# Altium footprint library smd-ipc.PCBLIB: 363 footprints (part 23 of 27) (continued)
## SQFP-S-28X28-352 [mm] (continued)
Top Overlay:
  circle w0.254: c-12.25,-12.25 r0.75
  lines w0.203: -13.67,-13.66 13.66,-13.66 13.66,13.66 -13.67,13.66 -13.67,-13.66
Mechanical 16:
  drawing of 356 lines, arcs and shapes, not listed
Mechanical 27:
  lines w0.2: -15.9,-15.9 -15.9,15.9 15.9,15.9 15.9,-15.9 -15.9,-15.9

## SQFP-S-28X28-360 [mm]
pads (360):
  rect 0.17x1.6 smd: 1(-13.35,-14.6) 2(-13.05,-14.6) 3(-12.75,-14.6) 4(-12.45,-14.6) 5(-12.15,-14.6) 6(-11.85,-14.6) 7(-11.55,-14.6) 8(-11.25,-14.6) 9(-10.95,-14.6) 10(-10.65,-14.6) 11(-10.35,-14.6) 12(-10.05,-14.6) 13(-9.75,-14.6) 14(-9.45,-14.6) 15(-9.15,-14.6) 16(-8.85,-14.6) 17(-8.55,-14.6) 18(-8.25,-14.6) 19(-7.95,-14.6) 20(-7.65,-14.6) 21(-7.35,-14.6) 22(-7.05,-14.6) 23(-6.75,-14.6) 24(-6.45,-14.6) 25(-6.15,-14.6) 26(-5.85,-14.6) 27(-5.55,-14.6) 28(-5.25,-14.6) 29(-4.95,-14.6) 30(-4.65,-14.6) 31(-4.35,-14.6) 32(-4.05,-14.6) 33(-3.75,-14.6) 34(-3.45,-14.6) 35(-3.15,-14.6) 36(-2.85,-14.6) 37(-2.55,-14.6) 38(-2.25,-14.6) 39(-1.95,-14.6) 40(-1.65,-14.6) 41(-1.35,-14.6) 42(-1.05,-14.6) 43(-0.75,-14.6) 44(-0.45,-14.6) 45(-0.15,-14.6) 46(0.15,-14.6) 47(0.45,-14.6) 48(0.75,-14.6) 49(1.05,-14.6) 50(1.35,-14.6) 51(1.65,-14.6) 52(1.95,-14.6) 53(2.25,-14.6) 54(2.55,-14.6) 55(2.85,-14.6) 56(3.15,-14.6) 57(3.45,-14.6) 58(3.75,-14.6) 59(4.05,-14.6) 60(4.35,-14.6) 61(4.65,-14.6) 62(4.95,-14.6) 63(5.25,-14.6) 64(5.55,-14.6) 65(5.85,-14.6) 66(6.15,-14.6) 67(6.45,-14.6) 68(6.75,-14.6) 69(7.05,-14.6) 70(7.35,-14.6) 71(7.65,-14.6) 72(7.95,-14.6) 73(8.25,-14.6) 74(8.55,-14.6) 75(8.85,-14.6) 76(9.15,-14.6) 77(9.45,-14.6) 78(9.75,-14.6) 79(10.05,-14.6) 80(10.35,-14.6) 81(10.65,-14.6) 82(10.95,-14.6) 83(11.25,-14.6) 84(11.55,-14.6) 85(11.85,-14.6) 86(12.15,-14.6) 87(12.45,-14.6) 88(12.75,-14.6) 89(13.05,-14.6) 90(13.35,-14.6) 181(13.35,14.6) 182(13.05,14.6) 183(12.75,14.6) 184(12.45,14.6) 185(12.15,14.6) 186(11.85,14.6) 187(11.55,14.6) 188(11.25,14.6) 189(10.95,14.6) 190(10.65,14.6) 191(10.35,14.6) 192(10.05,14.6) 193(9.75,14.6) 194(9.45,14.6) 195(9.15,14.6) 196(8.85,14.6) 197(8.55,14.6) 198(8.25,14.6) 199(7.95,14.6) 200(7.65,14.6) 201(7.35,14.6) 202(7.05,14.6) 203(6.75,14.6) 204(6.45,14.6) 205(6.15,14.6) 206(5.85,14.6) 207(5.55,14.6) 208(5.25,14.6) 209(4.95,14.6) 210(4.65,14.6) 211(4.35,14.6) 212(4.05,14.6) 213(3.75,14.6) 214(3.45,14.6) 215(3.15,14.6) 216(2.85,14.6) 217(2.55,14.6) 218(2.25,14.6) 219(1.95,14.6) 220(1.65,14.6) 221(1.35,14.6) 222(1.05,14.6) 223(0.75,14.6) 224(0.45,14.6) 225(0.15,14.6) 226(-0.15,14.6) 227(-0.45,14.6) 228(-0.75,14.6) 229(-1.05,14.6) 230(-1.35,14.6) 231(-1.65,14.6) 232(-1.95,14.6) 233(-2.25,14.6) 234(-2.55,14.6) 235(-2.85,14.6) 236(-3.15,14.6) 237(-3.45,14.6) 238(-3.75,14.6) 239(-4.05,14.6) 240(-4.35,14.6) 241(-4.65,14.6) 242(-4.95,14.6) 243(-5.25,14.6) 244(-5.55,14.6) 245(-5.85,14.6) 246(-6.15,14.6) 247(-6.45,14.6) 248(-6.75,14.6) 249(-7.05,14.6) 250(-7.35,14.6) 251(-7.65,14.6) 252(-7.95,14.6) 253(-8.25,14.6) 254(-8.55,14.6) 255(-8.85,14.6) 256(-9.15,14.6) 257(-9.45,14.6) 258(-9.75,14.6) 259(-10.05,14.6) 260(-10.35,14.6) 261(-10.65,14.6) 262(-10.95,14.6) 263(-11.25,14.6) 264(-11.55,14.6) 265(-11.85,14.6) 266(-12.15,14.6) 267(-12.45,14.6) 268(-12.75,14.6) 269(-13.05,14.6) 270(-13.35,14.6)
  rect 1.6x0.17 smd: 91(14.6,-13.35) 92(14.6,-13.05) 93(14.6,-12.75) 94(14.6,-12.45) 95(14.6,-12.15) 96(14.6,-11.85) 97(14.6,-11.55) 98(14.6,-11.25) 99(14.6,-10.95) 100(14.6,-10.65) 101(14.6,-10.35) 102(14.6,-10.05) 103(14.6,-9.75) 104(14.6,-9.45) 105(14.6,-9.15) 106(14.6,-8.85) 107(14.6,-8.55) 108(14.6,-8.25) 109(14.6,-7.95) 110(14.6,-7.65) 111(14.6,-7.35) 112(14.6,-7.05) 113(14.6,-6.75) 114(14.6,-6.45) 115(14.6,-6.15) 116(14.6,-5.85) 117(14.6,-5.55) 118(14.6,-5.25) 119(14.6,-4.95) 120(14.6,-4.65) 121(14.6,-4.35) 122(14.6,-4.05) 123(14.6,-3.75) 124(14.6,-3.45) 125(14.6,-3.15) 126(14.6,-2.85) 127(14.6,-2.55) 128(14.6,-2.25) 129(14.6,-1.95) 130(14.6,-1.65) 131(14.6,-1.35) 132(14.6,-1.05) 133(14.6,-0.75) 134(14.6,-0.45) 135(14.6,-0.15) 136(14.6,0.15) 137(14.6,0.45) 138(14.6,0.75) 139(14.6,1.05) 140(14.6,1.35) 141(14.6,1.65) 142(14.6,1.95) 143(14.6,2.25) 144(14.6,2.55) 145(14.6,2.85) 146(14.6,3.15) 147(14.6,3.45) 148(14.6,3.75) 149(14.6,4.05) 150(14.6,4.35) 151(14.6,4.65) 152(14.6,4.95) 153(14.6,5.25) 154(14.6,5.55) 155(14.6,5.85) 156(14.6,6.15) 157(14.6,6.45) 158(14.6,6.75) 159(14.6,7.05) 160(14.6,7.35) 161(14.6,7.65) 162(14.6,7.95) 163(14.6,8.25) 164(14.6,8.55) 165(14.6,8.85) 166(14.6,9.15) 167(14.6,9.45) 168(14.6,9.75) 169(14.6,10.05) 170(14.6,10.35) 171(14.6,10.65) 172(14.6,10.95) 173(14.6,11.25) 174(14.6,11.55) 175(14.6,11.85) 176(14.6,12.15) 177(14.6,12.45) 178(14.6,12.75) 179(14.6,13.05) 180(14.6,13.35) 271(-14.6,13.35) 272(-14.6,13.05) 273(-14.6,12.75) 274(-14.6,12.45) 275(-14.6,12.15) 276(-14.6,11.85) 277(-14.6,11.55) 278(-14.6,11.25) 279(-14.6,10.95) 280(-14.6,10.65) 281(-14.6,10.35) 282(-14.6,10.05) 283(-14.6,9.75) 284(-14.6,9.45) 285(-14.6,9.15) 286(-14.6,8.85) 287(-14.6,8.55) 288(-14.6,8.25) 289(-14.6,7.95) 290(-14.6,7.65) 291(-14.6,7.35) 292(-14.6,7.05) 293(-14.6,6.75) 294(-14.6,6.45) 295(-14.6,6.15) 296(-14.6,5.85) 297(-14.6,5.55) 298(-14.6,5.25) 299(-14.6,4.95) 300(-14.6,4.65) 301(-14.6,4.35) 302(-14.6,4.05) 303(-14.6,3.75) 304(-14.6,3.45) 305(-14.6,3.15) 306(-14.6,2.85) 307(-14.6,2.55) 308(-14.6,2.25) 309(-14.6,1.95) 310(-14.6,1.65) 311(-14.6,1.35) 312(-14.6,1.05) 313(-14.6,0.75) 314(-14.6,0.45) 315(-14.6,0.15) 316(-14.6,-0.15) 317(-14.6,-0.45) 318(-14.6,-0.75) 319(-14.6,-1.05) 320(-14.6,-1.35) 321(-14.6,-1.65) 322(-14.6,-1.95) 323(-14.6,-2.25) 324(-14.6,-2.55) 325(-14.6,-2.85) 326(-14.6,-3.15) 327(-14.6,-3.45) 328(-14.6,-3.75) 329(-14.6,-4.05) 330(-14.6,-4.35) 331(-14.6,-4.65) 332(-14.6,-4.95) 333(-14.6,-5.25) 334(-14.6,-5.55) 335(-14.6,-5.85) 336(-14.6,-6.15) 337(-14.6,-6.45) 338(-14.6,-6.75) 339(-14.6,-7.05) 340(-14.6,-7.35) 341(-14.6,-7.65) 342(-14.6,-7.95) 343(-14.6,-8.25) 344(-14.6,-8.55) 345(-14.6,-8.85) 346(-14.6,-9.15) 347(-14.6,-9.45) 348(-14.6,-9.75) 349(-14.6,-10.05) 350(-14.6,-10.35) 351(-14.6,-10.65) 352(-14.6,-10.95) 353(-14.6,-11.25) 354(-14.6,-11.55) 355(-14.6,-11.85) 356(-14.6,-12.15) 357(-14.6,-12.45) 358(-14.6,-12.75) 359(-14.6,-13.05) 360(-14.6,-13.35)
Top Overlay:
  circle w0.254: c-12.25,-12.25 r0.75
  lines w0.203: -13.67,-13.66 13.66,-13.66 13.66,13.66 -13.67,13.66 -13.67,-13.66
Mechanical 16:
  drawing of 364 lines, arcs and shapes, not listed
Mechanical 27:
  lines w0.2: -15.9,-15.9 -15.9,15.9 15.9,15.9 15.9,-15.9 -15.9,-15.9

## SQFP-S-32X32-184 [mm]
pads (184):
  rect 0.4x1.8 smd: 1(-14.625,-17) 2(-13.975,-17) 3(-13.325,-17) 4(-12.675,-17) 5(-12.025,-17) 6(-11.375,-17) 7(-10.725,-17) 8(-10.075,-17) 9(-9.425,-17) 10(-8.775,-17) 11(-8.125,-17) 12(-7.475,-17) 13(-6.825,-17) 14(-6.175,-17) 15(-5.525,-17) 16(-4.875,-17) 17(-4.225,-17) 18(-3.575,-17) 19(-2.925,-17) 20(-2.275,-17) 21(-1.625,-17) 22(-0.975,-17) 23(-0.325,-17) 24(0.325,-17) 25(0.975,-17) 26(1.625,-17) 27(2.275,-17) 28(2.925,-17) 29(3.575,-17) 30(4.225,-17) 31(4.875,-17) 32(5.525,-17) 33(6.175,-17) 34(6.825,-17) 35(7.475,-17) 36(8.125,-17) 37(8.775,-17) 38(9.425,-17) 39(10.075,-17) 40(10.725,-17) 41(11.375,-17) 42(12.025,-17) 43(12.675,-17) 44(13.325,-17) 45(13.975,-17) 46(14.625,-17) 93(14.625,17) 94(13.975,17) 95(13.325,17) 96(12.675,17) 97(12.025,17) 98(11.375,17) 99(10.725,17) 100(10.075,17) 101(9.425,17) 102(8.775,17) 103(8.125,17) 104(7.475,17) 105(6.825,17) 106(6.175,17) 107(5.525,17) 108(4.875,17) 109(4.225,17) 110(3.575,17) 111(2.925,17) 112(2.275,17) 113(1.625,17) 114(0.975,17) 115(0.325,17) 116(-0.325,17) 117(-0.975,17) 118(-1.625,17) 119(-2.275,17) 120(-2.925,17) 121(-3.575,17) 122(-4.225,17) 123(-4.875,17) 124(-5.525,17) 125(-6.175,17) 126(-6.825,17) 127(-7.475,17) 128(-8.125,17) 129(-8.775,17) 130(-9.425,17) 131(-10.075,17) 132(-10.725,17) 133(-11.375,17) 134(-12.025,17) 135(-12.675,17) 136(-13.325,17) 137(-13.975,17) 138(-14.625,17)
  rect 1.8x0.4 smd: 47(17,-14.625) 48(17,-13.975) 49(17,-13.325) 50(17,-12.675) 51(17,-12.025) 52(17,-11.375) 53(17,-10.725) 54(17,-10.075) 55(17,-9.425) 56(17,-8.775) 57(17,-8.125) 58(17,-7.475) 59(17,-6.825) 60(17,-6.175) 61(17,-5.525) 62(17,-4.875) 63(17,-4.225) 64(17,-3.575) 65(17,-2.925) 66(17,-2.275) 67(17,-1.625) 68(17,-0.975) 69(17,-0.325) 70(17,0.325) 71(17,0.975) 72(17,1.625) 73(17,2.275) 74(17,2.925) 75(17,3.575) 76(17,4.225) 77(17,4.875) 78(17,5.525) 79(17,6.175) 80(17,6.825) 81(17,7.475) 82(17,8.125) 83(17,8.775) 84(17,9.425) 85(17,10.075) 86(17,10.725) 87(17,11.375) 88(17,12.025) 89(17,12.675) 90(17,13.325) 91(17,13.975) 92(17,14.625) 139(-17,14.625) 140(-17,13.975) 141(-17,13.325) 142(-17,12.675) 143(-17,12.025) 144(-17,11.375) 145(-17,10.725) 146(-17,10.075) 147(-17,9.425) 148(-17,8.775) 149(-17,8.125) 150(-17,7.475) 151(-17,6.825) 152(-17,6.175) 153(-17,5.525) 154(-17,4.875) 155(-17,4.225) 156(-17,3.575) 157(-17,2.925) 158(-17,2.275) 159(-17,1.625) 160(-17,0.975) 161(-17,0.325) 162(-17,-0.325) 163(-17,-0.975) 164(-17,-1.625) 165(-17,-2.275) 166(-17,-2.925) 167(-17,-3.575) 168(-17,-4.225) 169(-17,-4.875) 170(-17,-5.525) 171(-17,-6.175) 172(-17,-6.825) 173(-17,-7.475) 174(-17,-8.125) 175(-17,-8.775) 176(-17,-9.425) 177(-17,-10.075) 178(-17,-10.725) 179(-17,-11.375) 180(-17,-12.025) 181(-17,-12.675) 182(-17,-13.325) 183(-17,-13.975) 184(-17,-14.625)
Top Overlay:
  circle w0.254: c-14.2,-14.2 r0.75
  lines w0.203: -15.77,-15.76 15.76,-15.76 15.76,15.76 -15.77,15.76 -15.77,-15.76
Mechanical 16:
  drawing of 188 lines, arcs and shapes, not listed
Mechanical 27:
  lines w0.2: -18.4,-18.4 -18.4,18.4 18.4,18.4 18.4,-18.4 -18.4,-18.4

## SQFP-S-32X32-240 [mm]
pads (240):
  rect 0.3x1.6 smd: 1(-14.75,-16.6) 2(-14.25,-16.6) 3(-13.75,-16.6) 4(-13.25,-16.6) 5(-12.75,-16.6) 6(-12.25,-16.6) 7(-11.75,-16.6) 8(-11.25,-16.6) 9(-10.75,-16.6) 10(-10.25,-16.6) 11(-9.75,-16.6) 12(-9.25,-16.6) 13(-8.75,-16.6) 14(-8.25,-16.6) 15(-7.75,-16.6) 16(-7.25,-16.6) 17(-6.75,-16.6) 18(-6.25,-16.6) 19(-5.75,-16.6) 20(-5.25,-16.6) 21(-4.75,-16.6) 22(-4.25,-16.6) 23(-3.75,-16.6) 24(-3.25,-16.6) 25(-2.75,-16.6) 26(-2.25,-16.6) 27(-1.75,-16.6) 28(-1.25,-16.6) 29(-0.75,-16.6) 30(-0.25,-16.6) 31(0.25,-16.6) 32(0.75,-16.6) 33(1.25,-16.6) 34(1.75,-16.6) 35(2.25,-16.6) 36(2.75,-16.6) 37(3.25,-16.6) 38(3.75,-16.6) 39(4.25,-16.6) 40(4.75,-16.6) 41(5.25,-16.6) 42(5.75,-16.6) 43(6.25,-16.6) 44(6.75,-16.6) 45(7.25,-16.6) 46(7.75,-16.6) 47(8.25,-16.6) 48(8.75,-16.6) 49(9.25,-16.6) 50(9.75,-16.6) 51(10.25,-16.6) 52(10.75,-16.6) 53(11.25,-16.6) 54(11.75,-16.6) 55(12.25,-16.6) 56(12.75,-16.6) 57(13.25,-16.6) 58(13.75,-16.6) 59(14.25,-16.6) 60(14.75,-16.6) 121(14.75,16.6) 122(14.25,16.6) 123(13.75,16.6) 124(13.25,16.6) 125(12.75,16.6) 126(12.25,16.6) 127(11.75,16.6) 128(11.25,16.6) 129(10.75,16.6) 130(10.25,16.6) 131(9.75,16.6) 132(9.25,16.6) 133(8.75,16.6) 134(8.25,16.6) 135(7.75,16.6) 136(7.25,16.6) 137(6.75,16.6) 138(6.25,16.6) 139(5.75,16.6) 140(5.25,16.6) 141(4.75,16.6) 142(4.25,16.6) 143(3.75,16.6) 144(3.25,16.6) 145(2.75,16.6) 146(2.25,16.6) 147(1.75,16.6) 148(1.25,16.6) 149(0.75,16.6) 150(0.25,16.6) 151(-0.25,16.6) 152(-0.75,16.6) 153(-1.25,16.6) 154(-1.75,16.6) 155(-2.25,16.6) 156(-2.75,16.6) 157(-3.25,16.6) 158(-3.75,16.6) 159(-4.25,16.6) 160(-4.75,16.6) 161(-5.25,16.6) 162(-5.75,16.6) 163(-6.25,16.6) 164(-6.75,16.6) 165(-7.25,16.6) 166(-7.75,16.6) 167(-8.25,16.6) 168(-8.75,16.6) 169(-9.25,16.6) 170(-9.75,16.6) 171(-10.25,16.6) 172(-10.75,16.6) 173(-11.25,16.6) 174(-11.75,16.6) 175(-12.25,16.6) 176(-12.75,16.6) 177(-13.25,16.6) 178(-13.75,16.6) 179(-14.25,16.6) 180(-14.75,16.6)
  rect 1.6x0.3 smd: 61(16.6,-14.75) 62(16.6,-14.25) 63(16.6,-13.75) 64(16.6,-13.25) 65(16.6,-12.75) 66(16.6,-12.25) 67(16.6,-11.75) 68(16.6,-11.25) 69(16.6,-10.75) 70(16.6,-10.25) 71(16.6,-9.75) 72(16.6,-9.25) 73(16.6,-8.75) 74(16.6,-8.25) 75(16.6,-7.75) 76(16.6,-7.25) 77(16.6,-6.75) 78(16.6,-6.25) 79(16.6,-5.75) 80(16.6,-5.25) 81(16.6,-4.75) 82(16.6,-4.25) 83(16.6,-3.75) 84(16.6,-3.25) 85(16.6,-2.75) 86(16.6,-2.25) 87(16.6,-1.75) 88(16.6,-1.25) 89(16.6,-0.75) 90(16.6,-0.25) 91(16.6,0.25) 92(16.6,0.75) 93(16.6,1.25) 94(16.6,1.75) 95(16.6,2.25) 96(16.6,2.75) 97(16.6,3.25) 98(16.6,3.75) 99(16.6,4.25) 100(16.6,4.75) 101(16.6,5.25) 102(16.6,5.75) 103(16.6,6.25) 104(16.6,6.75) 105(16.6,7.25) 106(16.6,7.75) 107(16.6,8.25) 108(16.6,8.75) 109(16.6,9.25) 110(16.6,9.75) 111(16.6,10.25) 112(16.6,10.75) 113(16.6,11.25) 114(16.6,11.75) 115(16.6,12.25) 116(16.6,12.75) 117(16.6,13.25) 118(16.6,13.75) 119(16.6,14.25) 120(16.6,14.75) 181(-16.6,14.75) 182(-16.6,14.25) 183(-16.6,13.75) 184(-16.6,13.25) 185(-16.6,12.75) 186(-16.6,12.25) 187(-16.6,11.75) 188(-16.6,11.25) 189(-16.6,10.75) 190(-16.6,10.25) 191(-16.6,9.75) 192(-16.6,9.25) 193(-16.6,8.75) 194(-16.6,8.25) 195(-16.6,7.75) 196(-16.6,7.25) 197(-16.6,6.75) 198(-16.6,6.25) 199(-16.6,5.75) 200(-16.6,5.25) 201(-16.6,4.75) 202(-16.6,4.25) 203(-16.6,3.75) 204(-16.6,3.25) 205(-16.6,2.75) 206(-16.6,2.25) 207(-16.6,1.75) 208(-16.6,1.25) 209(-16.6,0.75) 210(-16.6,0.25) 211(-16.6,-0.25) 212(-16.6,-0.75) 213(-16.6,-1.25) 214(-16.6,-1.75) 215(-16.6,-2.25) 216(-16.6,-2.75) 217(-16.6,-3.25) 218(-16.6,-3.75) 219(-16.6,-4.25) 220(-16.6,-4.75) 221(-16.6,-5.25) 222(-16.6,-5.75) 223(-16.6,-6.25) 224(-16.6,-6.75) 225(-16.6,-7.25) 226(-16.6,-7.75) 227(-16.6,-8.25) 228(-16.6,-8.75) 229(-16.6,-9.25) 230(-16.6,-9.75) 231(-16.6,-10.25) 232(-16.6,-10.75) 233(-16.6,-11.25) 234(-16.6,-11.75) 235(-16.6,-12.25) 236(-16.6,-12.75) 237(-16.6,-13.25) 238(-16.6,-13.75) 239(-16.6,-14.25) 240(-16.6,-14.75)
Top Overlay:
  circle w0.254: c-14.2,-14.2 r0.75
  lines w0.203: -15.77,-15.76 15.76,-15.76 15.76,15.76 -15.77,15.76 -15.77,-15.76
Mechanical 16:
  drawing of 244 lines, arcs and shapes, not listed
Mechanical 27:
  lines w0.2: -17.9,-17.9 -17.9,17.9 18.4,17.9 18.4,-17.9 -17.9,-17.9

## SQFP-S-32X32-248 [mm]
pads (248):
  rect 0.3x1.6 smd: 1(-15.25,-16.6) 2(-14.75,-16.6) 3(-14.25,-16.6) 4(-13.75,-16.6) 5(-13.25,-16.6) 6(-12.75,-16.6) 7(-12.25,-16.6) 8(-11.75,-16.6) 9(-11.25,-16.6) 10(-10.75,-16.6) 11(-10.25,-16.6) 12(-9.75,-16.6) 13(-9.25,-16.6) 14(-8.75,-16.6) 15(-8.25,-16.6) 16(-7.75,-16.6) 17(-7.25,-16.6) 18(-6.75,-16.6) 19(-6.25,-16.6) 20(-5.75,-16.6) 21(-5.25,-16.6) 22(-4.75,-16.6) 23(-4.25,-16.6) 24(-3.75,-16.6) 25(-3.25,-16.6) 26(-2.75,-16.6) 27(-2.25,-16.6) 28(-1.75,-16.6) 29(-1.25,-16.6) 30(-0.75,-16.6) 31(-0.25,-16.6) 32(0.25,-16.6) 33(0.75,-16.6) 34(1.25,-16.6) 35(1.75,-16.6) 36(2.25,-16.6) 37(2.75,-16.6) 38(3.25,-16.6) 39(3.75,-16.6) 40(4.25,-16.6) 41(4.75,-16.6) 42(5.25,-16.6) 43(5.75,-16.6) 44(6.25,-16.6) 45(6.75,-16.6) 46(7.25,-16.6) 47(7.75,-16.6) 48(8.25,-16.6) 49(8.75,-16.6) 50(9.25,-16.6) 51(9.75,-16.6) 52(10.25,-16.6) 53(10.75,-16.6) 54(11.25,-16.6) 55(11.75,-16.6) 56(12.25,-16.6) 57(12.75,-16.6) 58(13.25,-16.6) 59(13.75,-16.6) 60(14.25,-16.6) 61(14.75,-16.6) 62(15.25,-16.6) 125(15.25,16.6) 126(14.75,16.6) 127(14.25,16.6) 128(13.75,16.6) 129(13.25,16.6) 130(12.75,16.6) 131(12.25,16.6) 132(11.75,16.6) 133(11.25,16.6) 134(10.75,16.6) 135(10.25,16.6) 136(9.75,16.6) 137(9.25,16.6) 138(8.75,16.6) 139(8.25,16.6) 140(7.75,16.6) 141(7.25,16.6) 142(6.75,16.6) 143(6.25,16.6) 144(5.75,16.6) 145(5.25,16.6) 146(4.75,16.6) 147(4.25,16.6) 148(3.75,16.6) 149(3.25,16.6) 150(2.75,16.6) 151(2.25,16.6) 152(1.75,16.6) 153(1.25,16.6) 154(0.75,16.6) 155(0.25,16.6) 156(-0.25,16.6) 157(-0.75,16.6) 158(-1.25,16.6) 159(-1.75,16.6) 160(-2.25,16.6) 161(-2.75,16.6) 162(-3.25,16.6) 163(-3.75,16.6) 164(-4.25,16.6) 165(-4.75,16.6) 166(-5.25,16.6) 167(-5.75,16.6) 168(-6.25,16.6) 169(-6.75,16.6) 170(-7.25,16.6) 171(-7.75,16.6) 172(-8.25,16.6) 173(-8.75,16.6) 174(-9.25,16.6) 175(-9.75,16.6) 176(-10.25,16.6) 177(-10.75,16.6) 178(-11.25,16.6) 179(-11.75,16.6) 180(-12.25,16.6) 181(-12.75,16.6) 182(-13.25,16.6) 183(-13.75,16.6) 184(-14.25,16.6) 185(-14.75,16.6) 186(-15.25,16.6)
  rect 1.6x0.3 smd: 63(16.6,-15.25) 64(16.6,-14.75) 65(16.6,-14.25) 66(16.6,-13.75) 67(16.6,-13.25) 68(16.6,-12.75) 69(16.6,-12.25) 70(16.6,-11.75) 71(16.6,-11.25) 72(16.6,-10.75) 73(16.6,-10.25) 74(16.6,-9.75) 75(16.6,-9.25) 76(16.6,-8.75) 77(16.6,-8.25) 78(16.6,-7.75) 79(16.6,-7.25) 80(16.6,-6.75) 81(16.6,-6.25) 82(16.6,-5.75) 83(16.6,-5.25) 84(16.6,-4.75) 85(16.6,-4.25) 86(16.6,-3.75) 87(16.6,-3.25) 88(16.6,-2.75) 89(16.6,-2.25) 90(16.6,-1.75) 91(16.6,-1.25) 92(16.6,-0.75) 93(16.6,-0.25) 94(16.6,0.25) 95(16.6,0.75) 96(16.6,1.25) 97(16.6,1.75) 98(16.6,2.25) 99(16.6,2.75) 100(16.6,3.25) 101(16.6,3.75) 102(16.6,4.25) 103(16.6,4.75) 104(16.6,5.25) 105(16.6,5.75) 106(16.6,6.25) 107(16.6,6.75) 108(16.6,7.25) 109(16.6,7.75) 110(16.6,8.25) 111(16.6,8.75) 112(16.6,9.25) 113(16.6,9.75) 114(16.6,10.25) 115(16.6,10.75) 116(16.6,11.25) 117(16.6,11.75) 118(16.6,12.25) 119(16.6,12.75) 120(16.6,13.25) 121(16.6,13.75) 122(16.6,14.25) 123(16.6,14.75) 124(16.6,15.25) 187(-16.6,15.25) 188(-16.6,14.75) 189(-16.6,14.25) 190(-16.6,13.75) 191(-16.6,13.25) 192(-16.6,12.75) 193(-16.6,12.25) 194(-16.6,11.75) 195(-16.6,11.25) 196(-16.6,10.75) 197(-16.6,10.25) 198(-16.6,9.75) 199(-16.6,9.25) 200(-16.6,8.75) 201(-16.6,8.25) 202(-16.6,7.75) 203(-16.6,7.25) 204(-16.6,6.75) 205(-16.6,6.25) 206(-16.6,5.75) 207(-16.6,5.25) 208(-16.6,4.75) 209(-16.6,4.25) 210(-16.6,3.75) 211(-16.6,3.25) 212(-16.6,2.75) 213(-16.6,2.25) 214(-16.6,1.75) 215(-16.6,1.25) 216(-16.6,0.75) 217(-16.6,0.25) 218(-16.6,-0.25) 219(-16.6,-0.75) 220(-16.6,-1.25) 221(-16.6,-1.75) 222(-16.6,-2.25) 223(-16.6,-2.75) 224(-16.6,-3.25) 225(-16.6,-3.75) 226(-16.6,-4.25) 227(-16.6,-4.75) 228(-16.6,-5.25) 229(-16.6,-5.75) 230(-16.6,-6.25) 231(-16.6,-6.75) 232(-16.6,-7.25) 233(-16.6,-7.75) 234(-16.6,-8.25) 235(-16.6,-8.75) 236(-16.6,-9.25) 237(-16.6,-9.75) 238(-16.6,-10.25) 239(-16.6,-10.75) 240(-16.6,-11.25) 241(-16.6,-11.75) 242(-16.6,-12.25) 243(-16.6,-12.75) 244(-16.6,-13.25) 245(-16.6,-13.75) 246(-16.6,-14.25) 247(-16.6,-14.75) 248(-16.6,-15.25)
Top Overlay:
  circle w0.254: c-14.2,-14.2 r0.75
  lines w0.203: -15.77,-15.76 15.76,-15.76 15.76,15.76 -15.77,15.76 -15.77,-15.76
Mechanical 16:
  drawing of 252 lines, arcs and shapes, not listed
Mechanical 27:
  lines w0.2: -17.9,-17.9 -17.9,17.9 18.4,17.9 18.4,-17.9 -17.9,-17.9

## SQFP-S-32X32-304 [mm]
pads (304):
  rect 0.25x1.6 smd: 1(-15,-16.6) 2(-14.6,-16.6) 3(-14.2,-16.6) 4(-13.8,-16.6) 5(-13.4,-16.6) 6(-13,-16.6) 7(-12.6,-16.6) 8(-12.2,-16.6) 9(-11.8,-16.6) 10(-11.4,-16.6) 11(-11,-16.6) 12(-10.6,-16.6) 13(-10.2,-16.6) 14(-9.8,-16.6) 15(-9.4,-16.6) 16(-9,-16.6) 17(-8.6,-16.6) 18(-8.2,-16.6) 19(-7.8,-16.6) 20(-7.4,-16.6) 21(-7,-16.6) 22(-6.6,-16.6) 23(-6.2,-16.6) 24(-5.8,-16.6) 25(-5.4,-16.6) 26(-5,-16.6) 27(-4.6,-16.6) 28(-4.2,-16.6) 29(-3.8,-16.6) 30(-3.4,-16.6) 31(-3,-16.6) 32(-2.6,-16.6) 33(-2.2,-16.6) 34(-1.8,-16.6) 35(-1.4,-16.6) 36(-1,-16.6) 37(-0.6,-16.6) 38(-0.2,-16.6) 39(0.2,-16.6) 40(0.6,-16.6) 41(1,-16.6) 42(1.4,-16.6) 43(1.8,-16.6) 44(2.2,-16.6) 45(2.6,-16.6) 46(3,-16.6) 47(3.4,-16.6) 48(3.8,-16.6) 49(4.2,-16.6) 50(4.6,-16.6) 51(5,-16.6) 52(5.4,-16.6) 53(5.8,-16.6) 54(6.2,-16.6) 55(6.6,-16.6) 56(7,-16.6) 57(7.4,-16.6) 58(7.8,-16.6) 59(8.2,-16.6) 60(8.6,-16.6) 61(9,-16.6) 62(9.4,-16.6) 63(9.8,-16.6) 64(10.2,-16.6) 65(10.6,-16.6) 66(11,-16.6) 67(11.4,-16.6) 68(11.8,-16.6) 69(12.2,-16.6) 70(12.6,-16.6) 71(13,-16.6) 72(13.4,-16.6) 73(13.8,-16.6) 74(14.2,-16.6) 75(14.6,-16.6) 76(15,-16.6) 153(15,16.6) 154(14.6,16.6) 155(14.2,16.6) 156(13.8,16.6) 157(13.4,16.6) 158(13,16.6) 159(12.6,16.6) 160(12.2,16.6) 161(11.8,16.6) 162(11.4,16.6) 163(11,16.6) 164(10.6,16.6) 165(10.2,16.6) 166(9.8,16.6) 167(9.4,16.6) 168(9,16.6) 169(8.6,16.6) 170(8.2,16.6) 171(7.8,16.6) 172(7.4,16.6) 173(7,16.6) 174(6.6,16.6) 175(6.2,16.6) 176(5.8,16.6) 177(5.4,16.6) 178(5,16.6) 179(4.6,16.6) 180(4.2,16.6) 181(3.8,16.6) 182(3.4,16.6) 183(3,16.6) 184(2.6,16.6) 185(2.2,16.6) 186(1.8,16.6) 187(1.4,16.6) 188(1,16.6) 189(0.6,16.6) 190(0.2,16.6) 191(-0.2,16.6) 192(-0.6,16.6) 193(-1,16.6) 194(-1.4,16.6) 195(-1.8,16.6) 196(-2.2,16.6) 197(-2.6,16.6) 198(-3,16.6) 199(-3.4,16.6) 200(-3.8,16.6) 201(-4.2,16.6) 202(-4.6,16.6) 203(-5,16.6) 204(-5.4,16.6) 205(-5.8,16.6) 206(-6.2,16.6) 207(-6.6,16.6) 208(-7,16.6) 209(-7.4,16.6) 210(-7.8,16.6) 211(-8.2,16.6) 212(-8.6,16.6) 213(-9,16.6) 214(-9.4,16.6) 215(-9.8,16.6) 216(-10.2,16.6) 217(-10.6,16.6) 218(-11,16.6) 219(-11.4,16.6) 220(-11.8,16.6) 221(-12.2,16.6) 222(-12.6,16.6) 223(-13,16.6) 224(-13.4,16.6) 225(-13.8,16.6) 226(-14.2,16.6) 227(-14.6,16.6) 228(-15,16.6)
  rect 1.6x0.25 smd: 77(16.6,-15) 78(16.6,-14.6) 79(16.6,-14.2) 80(16.6,-13.8) 81(16.6,-13.4) 82(16.6,-13) 83(16.6,-12.6) 84(16.6,-12.2) 85(16.6,-11.8) 86(16.6,-11.4) 87(16.6,-11) 88(16.6,-10.6) 89(16.6,-10.2) 90(16.6,-9.8) 91(16.6,-9.4) 92(16.6,-9) 93(16.6,-8.6) 94(16.6,-8.2) 95(16.6,-7.8) 96(16.6,-7.4) 97(16.6,-7) 98(16.6,-6.6) 99(16.6,-6.2) 100(16.6,-5.8) 101(16.6,-5.4) 102(16.6,-5) 103(16.6,-4.6) 104(16.6,-4.2) 105(16.6,-3.8) 106(16.6,-3.4) 107(16.6,-3) 108(16.6,-2.6) 109(16.6,-2.2) 110(16.6,-1.8) 111(16.6,-1.4) 112(16.6,-1) 113(16.6,-0.6) 114(16.6,-0.2) 115(16.6,0.2) 116(16.6,0.6) 117(16.6,1) 118(16.6,1.4) 119(16.6,1.8) 120(16.6,2.2) 121(16.6,2.6) 122(16.6,3) 123(16.6,3.4) 124(16.6,3.8) 125(16.6,4.2) 126(16.6,4.6) 127(16.6,5) 128(16.6,5.4) 129(16.6,5.8) 130(16.6,6.2) 131(16.6,6.6) 132(16.6,7) 133(16.6,7.4) 134(16.6,7.8) 135(16.6,8.2) 136(16.6,8.6) 137(16.6,9) 138(16.6,9.4) 139(16.6,9.8) 140(16.6,10.2) 141(16.6,10.6) 142(16.6,11) 143(16.6,11.4) 144(16.6,11.8) 145(16.6,12.2) 146(16.6,12.6) 147(16.6,13) 148(16.6,13.4) 149(16.6,13.8) 150(16.6,14.2) 151(16.6,14.6) 152(16.6,15) 229(-16.6,15) 230(-16.6,14.6) 231(-16.6,14.2) 232(-16.6,13.8) 233(-16.6,13.4) 234(-16.6,13) 235(-16.6,12.6) 236(-16.6,12.2) 237(-16.6,11.8) 238(-16.6,11.4) 239(-16.6,11) 240(-16.6,10.6) 241(-16.6,10.2) 242(-16.6,9.8) 243(-16.6,9.4) 244(-16.6,9) 245(-16.6,8.6) 246(-16.6,8.2) 247(-16.6,7.8) 248(-16.6,7.4) 249(-16.6,7) 250(-16.6,6.6) 251(-16.6,6.2) 252(-16.6,5.8) 253(-16.6,5.4) 254(-16.6,5) 255(-16.6,4.6) 256(-16.6,4.2) 257(-16.6,3.8) 258(-16.6,3.4) 259(-16.6,3) 260(-16.6,2.6) 261(-16.6,2.2) 262(-16.6,1.8) 263(-16.6,1.4) 264(-16.6,1) 265(-16.6,0.6) 266(-16.6,0.2) 267(-16.6,-0.2) 268(-16.6,-0.6) 269(-16.6,-1) 270(-16.6,-1.4) 271(-16.6,-1.8) 272(-16.6,-2.2) 273(-16.6,-2.6) 274(-16.6,-3) 275(-16.6,-3.4) 276(-16.6,-3.8) 277(-16.6,-4.2) 278(-16.6,-4.6) 279(-16.6,-5) 280(-16.6,-5.4) 281(-16.6,-5.8) 282(-16.6,-6.2) 283(-16.6,-6.6) 284(-16.6,-7) 285(-16.6,-7.4) 286(-16.6,-7.8) 287(-16.6,-8.2) 288(-16.6,-8.6) 289(-16.6,-9) 290(-16.6,-9.4) 291(-16.6,-9.8) 292(-16.6,-10.2) 293(-16.6,-10.6) 294(-16.6,-11) 295(-16.6,-11.4) 296(-16.6,-11.8) 297(-16.6,-12.2) 298(-16.6,-12.6) 299(-16.6,-13) 300(-16.6,-13.4) 301(-16.6,-13.8) 302(-16.6,-14.2) 303(-16.6,-14.6) 304(-16.6,-15)
Top Overlay:
  circle w0.254: c-14.2,-14.2 r0.75
  lines w0.203: -15.77,-15.76 15.76,-15.76 15.76,15.76 -15.77,15.76 -15.77,-15.76
Mechanical 16:
  drawing of 308 lines, arcs and shapes, not listed
Mechanical 27:
  lines w0.2: -17.9,-17.9 -17.9,17.9 18.4,17.9 18.4,-17.9 -17.9,-17.9